# Altium footprint library mainlib.PcbLib: 95 footprints (part 1 of 6)
Each footprint in its own frame and in the unit in brackets; x right, y up, seen from the top. Pads: shape width x height; smd on the part's side, far side on the other; paste and mask are expansions set on the pad; w line width, h text height; cw(c..) or ccw(c..) is an arc to the next point about the centre after c.
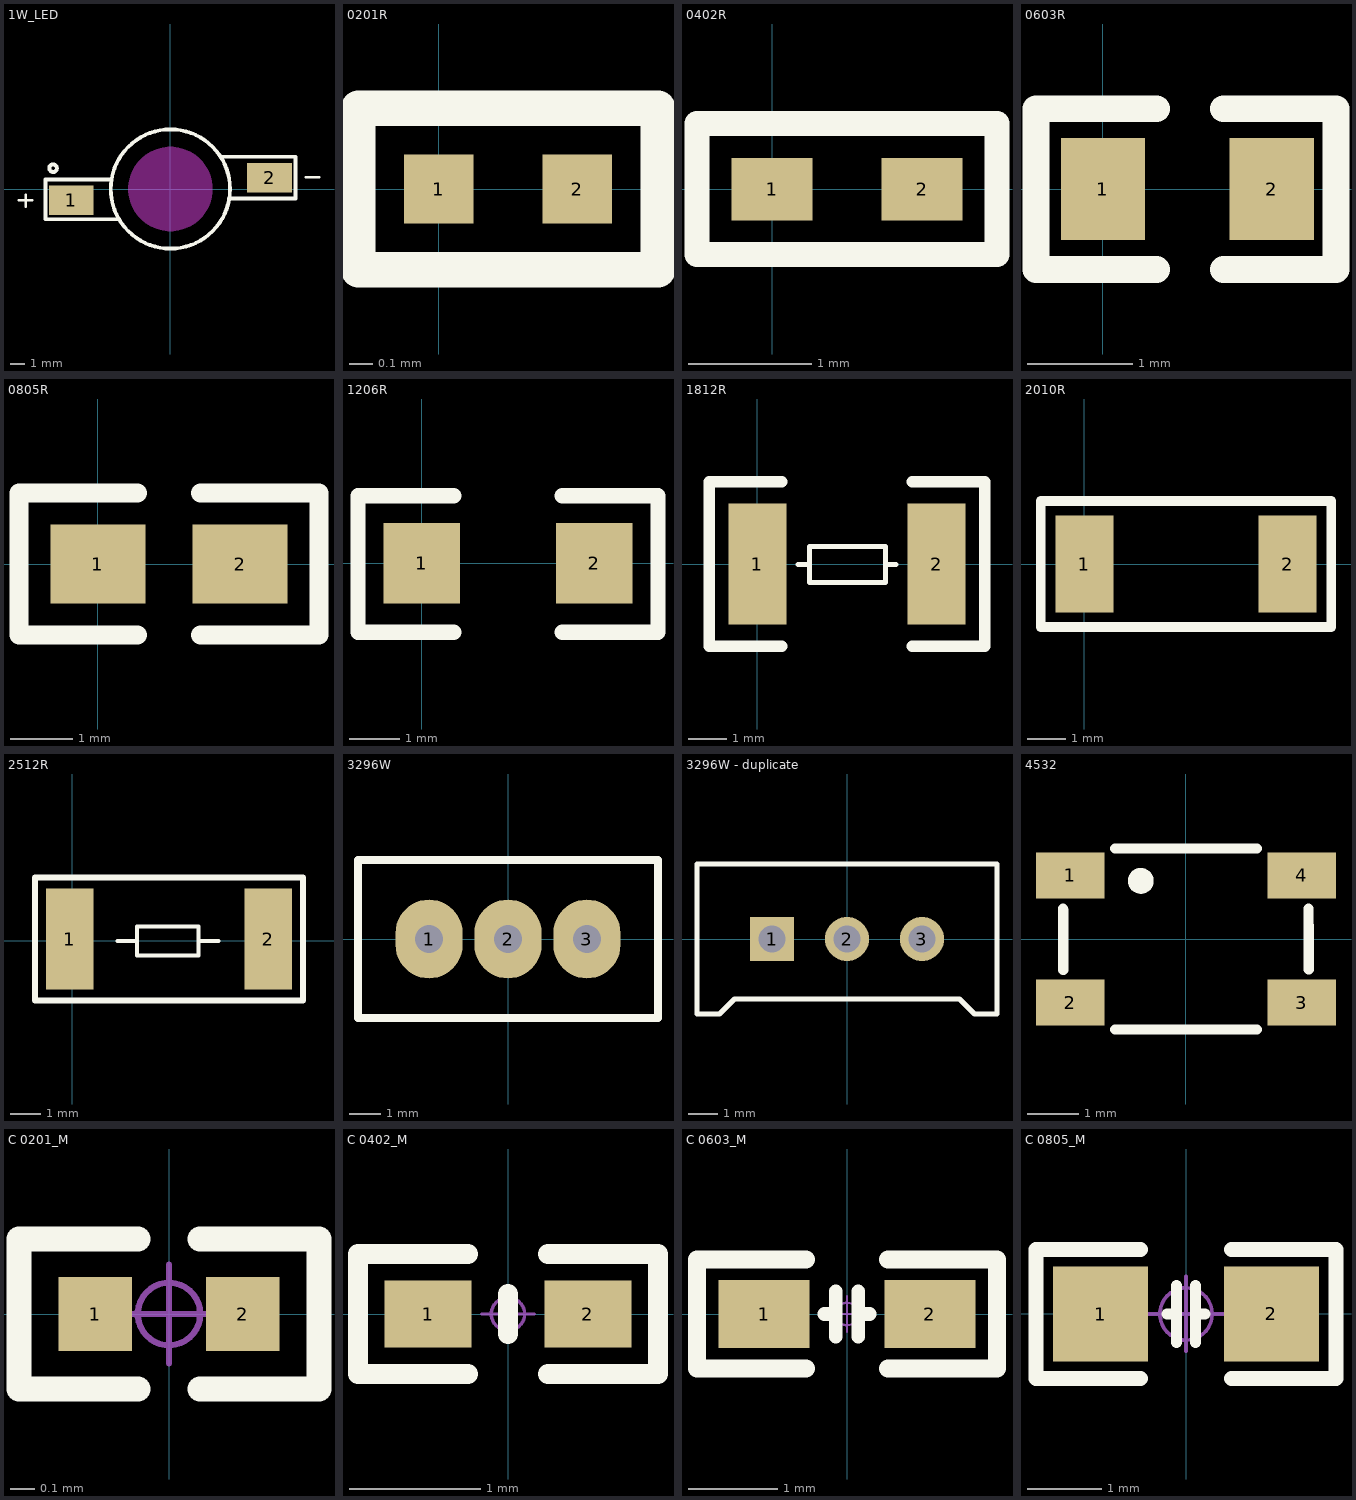
[diagram p0: the footprints below, top view; thin cyan lines are the x and y axes]

## 1W_LED [mm]
pads (2):
  rect 3x2 smd: 1(-6.65,-0.75) 2(6.65,0.75)
Top Overlay:
  circle w0.254: c-7.874,1.397 r0.254
  circle w0.254: c0,0 r4
  lines w0.178: -10.16,-0.762 -9.271,-0.762 ; -9.711,-1.192 -9.711,-0.408 ; 9.076,0.8 9.965,0.8
  lines w0.254: -4.064,0.635 -8.382,0.635 -8.382,-2.032 -3.429,-2.032 ; 3.429,2.159 8.382,2.159 8.382,-0.635 3.937,-0.635
Keep-Out Layer:
  board cut-out: 0,-2.82 -0.185,-2.82 -0.551,-2.772 -0.908,-2.676 -1.25,-2.534 -1.57,-2.35 -1.863,-2.125 -2.125,-1.863 -2.35,-1.57 -2.534,-1.25 -2.676,-0.908 -2.772,-0.551 -2.82,-0.185 -2.82,0 -2.82,0.185 -2.772,0.551 -2.676,0.908 -2.534,1.25 -2.35,1.57 -2.125,1.863 -1.863,2.125 -1.57,2.35 -1.25,2.534 -0.908,2.676 -0.551,2.772 -0.185,2.82 0,2.82 0.185,2.82 0.551,2.772 0.908,2.676 1.25,2.534 1.57,2.35 1.863,2.125 2.125,1.863 2.35,1.57 2.534,1.25 2.676,0.908 2.772,0.551 2.82,0.185 2.82,0 2.82,-0.185 2.772,-0.551 2.676,-0.908 2.534,-1.25 2.35,-1.57 2.125,-1.863 1.863,-2.125 1.57,-2.35 1.25,-2.534 0.908,-2.676 0.551,-2.772 0.185,-2.82

## 0201R [mm]
pads (2):
  rect 0.3x0.3 smd: 1(0,0) 2(0.6,0)
Top Overlay:
  lines w0.152: -0.35,-0.35 0.95,-0.35 0.95,0.35 -0.35,0.35 -0.35,-0.35
3D body "0201R.STEP": height 0.34, standoff 0, extent -0.086,-0.165 0.594,0.165

## 0402R [mil]
pads (2):
  rect 26x20 smd: 1(0,0) 2(48,0)
Top Overlay:
  lines w8: -24,-21 72,-21 72,21 -24,21 -24,-21
3D body "0402R.STEP": height 13.27, standoff -0.51, extent 4.06,-9.84 43.43,9.85

## 0603R [mm]
pads (2):
  rect 0.8x0.965 smd: 1(0,0) 2(1.6,0)
Top Overlay:
  lines w0.254: 0.508,-0.762 -0.635,-0.762 -0.635,0.762 0.508,0.762 ; 1.143,-0.762 2.21,-0.762 2.21,0.762 1.143,0.762
3D body "RES0603.STEP": height 0.45, standoff 0, extent -0.038,-0.41 1.562,0.41

## 0805R [mil]
pads (2):
  rect 60x50 smd: 1(0,0) 2(90,0)
Top Overlay:
  lines w12: 25,-45 -50,-45 -50,45 25,45 ; 65,-45 140,-45 140,45 65,45
3D body "RES0805.STEP": height 15, standoff -1.14, extent 1.26,-24.6 80,24.61

## 1206R [mil]
pads (2):
  rect 60x62.99 smd: 1(0,0) 2(135,0)
Top Overlay:
  lines w12: 25,-54 -50,-54 -50,53 25,53 ; 110,-54 185,-54 185,53 110,53
3D body "R1206.STEP": height 23.62, standoff 0, extent 7.01,-31.49 133,31.5

## 1812R [mil]
pads (2):
  rect 60x125 smd: 1(0,0) 2(185,0)
Top Overlay:
  lines w5.12: 42,-0.61 53.63,-0.61 ; 132.37,-0.61 143,-0.61 ; 53.63,-19.31 132.37,-19.31 132.37,18.09 53.63,18.09 53.63,-19.31
  lines w12: 25,-85 -50,-85 -50,85 25,85 ; 160,-85 235,-85 235,85 160,85
3D body "User Library-Resistors1812.STEP": height 24.11, standoff -0.49, extent -4.57,-63.49 174.56,63.48

## 2010R [mm]
pads (2):
  rect 1.52x2.54 smd: 1(0,0) 2(5.33,0)
Top Overlay:
  lines w0.254: -1.145,-1.651 -1.145,0.635 -1.145,1.651 3.935,1.651 6.475,1.651 6.475,-0.635 6.475,-1.651 3.935,-1.651 -1.145,-1.651
3D body "2010R.STEP": height 0.47, standoff 0, extent 0.167,-1.251 5.167,1.251

## 2512R [mil]
pads (2):
  rect 61x129.92 smd: 1(-3.11,2) 2(251.89,2)
Top Overlay:
  lines w5.12: 58.04,-0.61 83.63,-0.61 ; 162.37,-0.61 187.96,-0.61 ; 83.63,-19.31 83.63,18.09 162.37,18.09 162.37,-19.31 83.63,-19.31
  lines w7.87: -47.39,-76.74 -47.39,80.74 296.17,80.74 296.17,-76.74 -47.39,-76.74
3D body "User Library-res2512_body.step": height 24.44, standoff 0, extent 0,-63 248.79,63

## 3296W [mil]
pads (3):
  oval 85x100 hole 35: 1(-100,0) 2(0,0) 3(100,0)
Top Overlay:
  lines w10: -190,-100 190,-100 190,100 -190,100 -190,-100
3D body "User Library-3296W.step": height 454.72, standoff -62.99, extent -187.6,-94.49 187.6,94.49

## 3296W - duplicate [mm]
pads (3):
  rect 1.5x1.5 hole 0.9: 1(-2.54,0)
  round 1.5 hole 0.9: 2(0,0) 3(2.54,0)
Top Overlay:
  lines w0.178: -5.08,-2.54 -4.318,-2.54 -3.81,-2.032 3.81,-2.032 4.318,-2.54 5.08,-2.54 5.08,2.54 -5.08,2.54 -5.08,-2.54
3D body "User Library-3296_Bourns.STEP": height 11.55, standoff -7.62, extent -4.765,-2.415 4.765,2.415

## 4532 [mm] "ACT45B封装"
pads (4):
  rect 1.35x0.9 smd: 1(-2.275,1.25) 2(-2.275,-1.25) 3(2.275,-1.25) 4(2.275,1.25)
Top Overlay:
  circle w0.254: c-0.889,1.143 r0.127
  lines w0.2: -2.418,0.6 -2.413,-0.604 ; -2.415,0.569 -2.413,-0.003 ; 0,-1.778 -1.397,-1.778 1.397,-1.778 ; 0,1.778 -1.397,1.778 1.397,1.778 ; 2.413,-0.596 2.407,0.597 2.413,0
3D body "123.step": height 2.56, standoff -0.03, extent -2.25,-1.651 2.25,1.534

## C 0201_M [mm] "无极性贴片电容"
pads (2):
  rect 0.3x0.3 smd: 1(-0.3,0) 2(0.3,0)
Top Overlay:
  lines w0.102: -0.127,-0.305 -0.61,-0.305 -0.61,0.305 -0.127,0.305 ; 0.127,-0.305 0.61,-0.305 0.61,0.305 0.127,0.305
Mechanical 15:
  circle w0.025: c0,0 r0.127
  lines w0.025: -0.2,0 0.2,0 ; 0,-0.2 0,0.2
3D body "C 0201.STEP": height 0.31, standoff -0.01, extent -0.3,-0.16 0.3,0.16

## C 0402_M [mil] "无极性贴片电容"
pads (2):
  rect 26x20 smd: 1(-24,0) 2(24,0)
Top Overlay:
  lines w6: -12,-18 -45,-18 -45,18 -12,18 ; 0,-6 0,6 ; 12,-18 45,-18 45,18 12,18
Mechanical 15:
  circle w1: c0,0 r5
  lines w1: -7.87,0 7.87,0 ; 0,-7.87 0,7.87
3D body "C 0402.STEP": height 20.68, standoff 0.21, extent -19.69,-10.24 19.69,10.24

## C 0603_M [mil] "无极性贴片电容"
pads (2):
  rect 40x30 smd: 1(-36.5,0) 2(36.5,0)
Top Overlay:
  lines w6: -10,0 -5,0 ; -5,-10 -5,10 ; 5,-10 5,10 ; 5,0 10,0
  lines w8: -18,-24 -66,-24 -66,24 -18,24 ; 18,-24 66,-24 66,24 18,24
Mechanical 15:
  circle w1: c0,0 r5
  lines w1: -7.87,0 7.87,0 ; 0,-7.87 0,7.87
3D body "C 0603.STEP": height 31.89, standoff -0.39, extent -31.5,-16.14 31.5,16.14

## C 0805_M [mil] "无极性贴片电容"
height 19.68
pads (2):
  rect 50x50 smd: 1(-45.01,-0.01) 2(45,0)
Top Overlay:
  lines w6: -10,0 -5,0 ; -5,-15 -5,15 ; 5,-15 5,15 ; 5,0 10,0
  lines w8: -24,-34 -79,-34 -79,34 -24,34 ; 23.99,-34.01 78.99,-34.01 78.99,33.99 23.99,33.99
Mechanical 15:
  circle w1.97: c0,0 r13.78
  lines w1.97: -19.68,0 19.68,0 ; 0,-19.68 0,19.68
3D body "C 0805.STEP": height 20.08, standoff -0.39, extent -39.37,-24.02 39.37,24.02